# Altium footprint library PCB贴片元件封装库.pcblib: 366 footprints (part 22 of 23)
Each footprint in its own frame and in the unit in brackets; x right, y up, seen from the top. Pads: shape width x height; smd on the part's side, far side on the other; paste and mask are expansions set on the pad; w line width, h text height; cw(c..) or ccw(c..) is an arc to the next point about the centre after c.
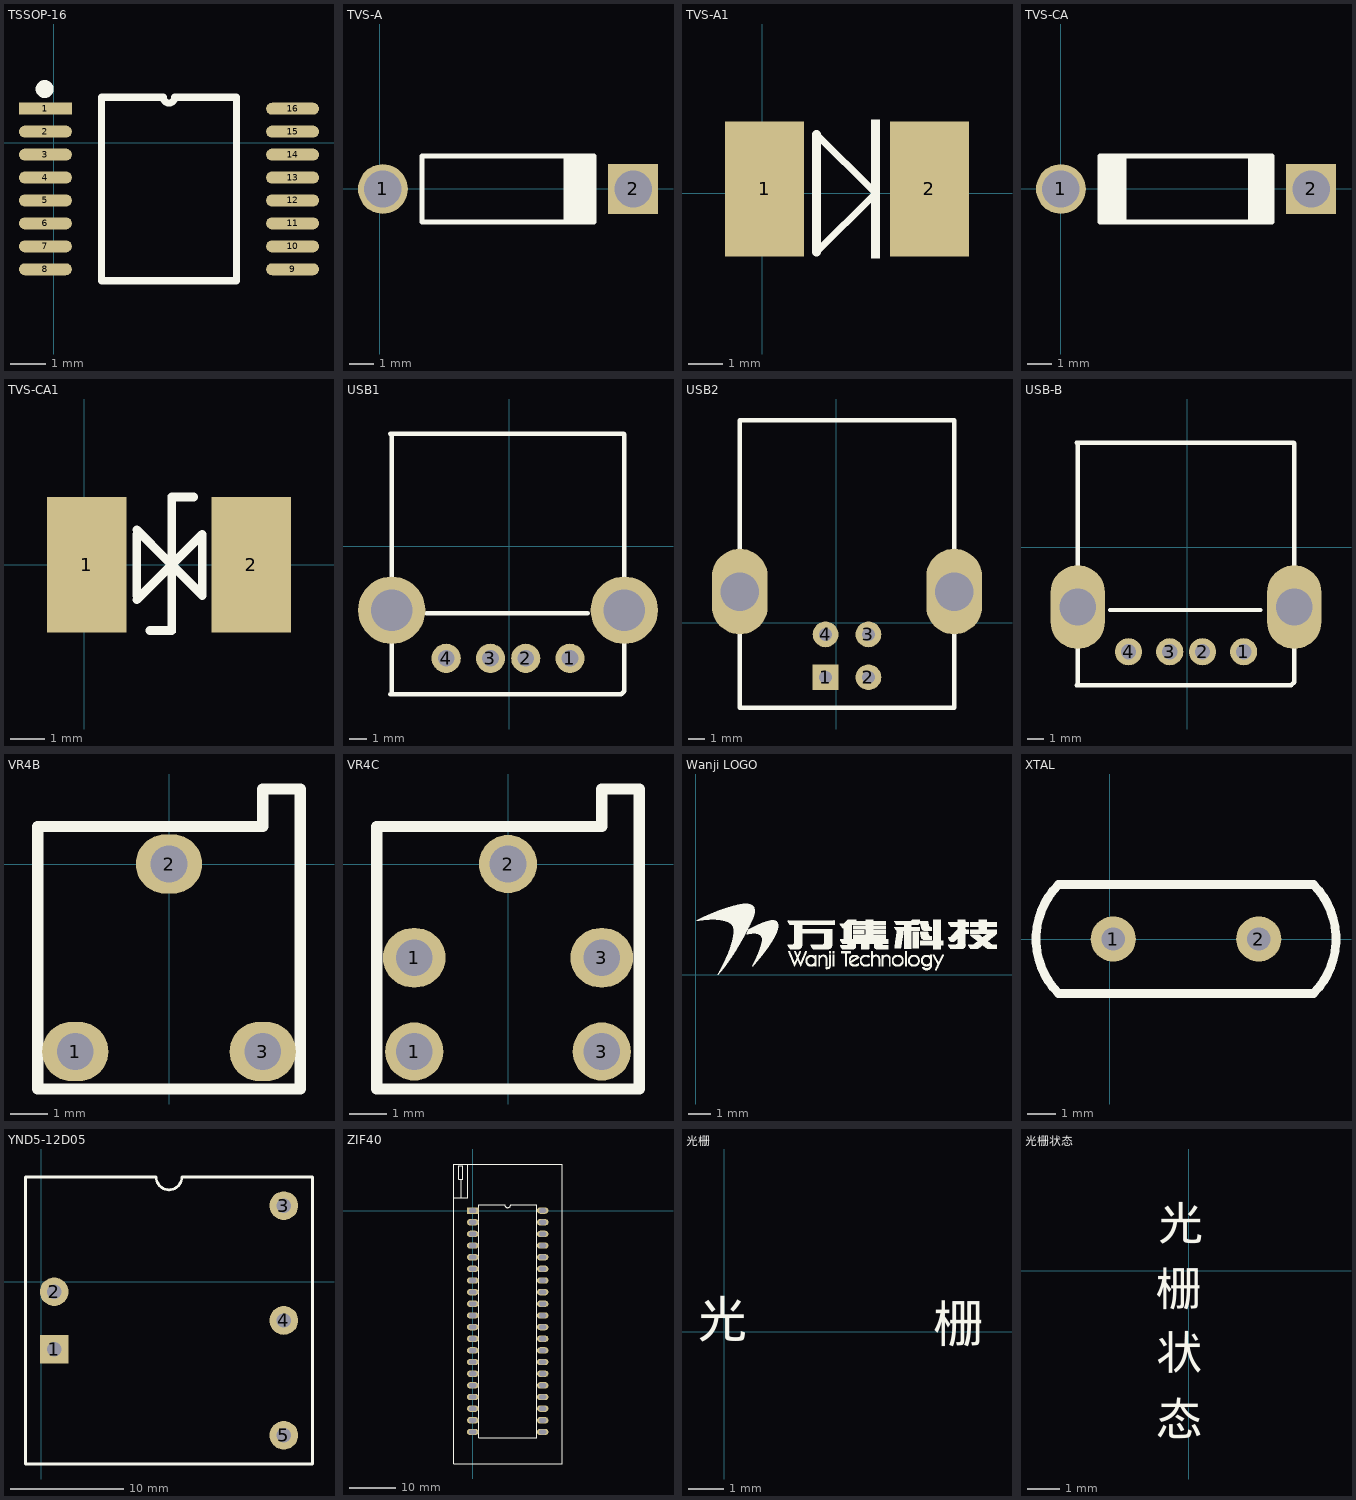
[diagram p21: the footprints below, top view; thin cyan lines are the x and y axes]

## TSSOP-16 [mm]
pads (16):
  rect 1.5x0.34 smd: 1(-0.232,0.968)
  oval 1.5x0.34 smd: 2(-0.232,0.318) 3(-0.232,-0.332) 4(-0.232,-0.982) 5(-0.232,-1.632) 6(-0.232,-2.282) 7(-0.232,-2.932) 8(-0.232,-3.582) 9(6.768,-3.582) 10(6.768,-2.932) 11(6.768,-2.282) 12(6.768,-1.632) 13(6.768,-0.982) 14(6.768,-0.332) 15(6.768,0.318) 16(6.768,0.968)
TopOverlay:
  circle w0.254: c-0.254,1.524 r0.127
  lines w0.2: 1.353,-3.907 5.183,-3.907 5.183,1.293 3.43,1.293 cw(c3.268,1.293) 3.106,1.293 1.353,1.293 1.353,-3.907

## TVS-A [mil]
pads (2):
  round 80 hole 60: 1(5,0)
  rect 80x80 hole 60: 2(406.57,0)
TopOverlay:
  rectangle: 295,-53.15 347.52,53.15
  lines w7.87: 343.58,-53.15 67.99,-53.15 67.99,53.15 343.58,53.15

## TVS-A1 [mm]
pads (2):
  rect 2.3x3.94 smd: 1(0.073,0.127) 2(4.873,0.127)
TopOverlay:
  rectangle: 3.175,-1.905 3.429,2.159
  lines w0.2: 1.587,-1.714 3.238,-0.064 ; 1.587,1.714 3.238,0.064
  lines w0.254: 1.587,-1.714 1.587,1.714

## TVS-CA [mil]
pads (2):
  round 80 hole 60: 1(0,0)
  rect 80x80 hole 60: 2(401.57,0)
TopOverlay:
  rectangle: 66.02,-53.15 105,53.15
  rectangle: 300,-53.15 342.52,53.15
  lines w7.87: 338.58,-53.15 62.99,-53.15 62.99,53.15 338.58,53.15

## TVS-CA1 [mm]
pads (2):
  rect 2.3x3.94 smd: 1(0.073,0) 2(4.848,0)
TopOverlay:
  rectangle: 2.413,-1.985 2.667,2.032
  lines w0.254: 1.524,-1.016 2.54,0 ; 1.524,-0.889 1.524,0.889 ; 1.524,1.016 2.413,0.127 ; 1.905,-1.905 2.54,-1.905 ; 2.54,1.973 3.175,1.973 ; 2.54,0 3.429,-0.889 3.429,0.889 2.54,0

## USB1 [mil]
pads (6):
  round 65 hole 37: 1(135,-250) 2(36.5,-250) 3(-42,-250) 4(-140.6,-250)
  round 150 hole 93: ""(-262,-143) ""(256,-143)
TopOverlay:
  lines w10: -265,-330 249,-330 256,-323 256,-143 256,249 255,250 -265,250 -262,247 -262,227 -262,-143 -262,-327 ; -185,-150 175,-150

## USB2 [mil]
pads (6):
  rect 60x60 hole 30: 1(-25,-127.6)
  round 60 hole 30: 2(75,-127.6) 3(75,-27.6) 4(-25,-27.6)
  oval 130x200 hole 90: ""(-225,72.4) ""(275,72.4)
TopOverlay:
  lines w10: -225,-199 -225,472.4 275,472.4 275,-199 -225,-199

## USB-B [mil]
pads (6):
  round 65 hole 37: 1(135,-250) 2(36.5,-250) 3(-42,-250) 4(-140.6,-250)
  oval 130x200 hole 88: ""(-262,-143) ""(256,-143)
TopOverlay:
  lines w10: -265,-330 249,-330 256,-323 256,-143 256,249 255,250 -265,250 -262,247 -262,227 -262,-143 -262,-327 ; -185,-150 175,-150

## VR4B [mm]
pads (3):
  oval 1.8x1.6 hole 1: 1(-2.54,-5.08) 2(0,0) 3(2.54,-5.08)
TopOverlay:
  lines w0.305: -3.556,-6.096 3.556,-6.096 3.556,2.032 2.54,2.032 2.54,1.016 -3.556,1.016 -3.556,-6.096

## VR4C [mm]
pads (5):
  round 1.575 hole 1: 1(-2.54,-5.08) 2(0,0) 3(2.54,-5.08)
  oval 1.7x1.6 hole 1: 1(-2.54,-2.54) 3(2.54,-2.54)
TopOverlay:
  lines w0.305: -3.556,-6.096 -3.556,1.016 2.54,1.016 2.54,2.032 3.556,2.032 3.556,-6.096 -3.556,-6.096

## Wanji LOGO [mil]
TopOverlay:
  drawing of 6345 lines, arcs and shapes, not listed

## XTAL [mil]
pads (2):
  round 62 hole 32: 1(5,0) 2(205,0)
TopOverlay:
  lines w12: -70,-75 cw(c5,0) -70,75 280,75 cw(c205,0) 280,-75 -70,-75

## YND5-12D05 [mil]
pads (5):
  rect 100x100 hole 50: 1(45,-235)
  round 100 hole 50: 2(45,-35) 3(845,265) 4(845,-135) 5(845,-535)
TopOverlay:
  lines w10: -55,-635 945,-635 945,365 490,365 cw(c445,365) 400,365 -55,365 -55,-635

## ZIF40 [mm]
height 1.1
pads (40):
  rect 2.5x1.38 hole 1 slot 1.5 at 0 deg: 1(0,0)
  oval 2.5x1.38 hole 1 slot 1.5 at 0 deg: 2(0,-2.54) 3(0,-5.08) 4(0,-7.62) 5(0,-10.16) 6(0,-12.7) 7(0,-15.24) 8(0,-17.78) 9(0,-20.32) 10(0,-22.86) 11(0,-25.4) 12(0,-27.94) 13(0,-30.48) 14(0,-33.02) 15(0,-35.56) 16(0,-38.1) 17(0,-40.64) 18(0,-43.18) 19(0,-45.72) 20(0,-48.26) 21(15.24,-48.26) 22(15.24,-45.72) 23(15.24,-43.18) 24(15.24,-40.64) 25(15.24,-38.1) 26(15.24,-35.56) 27(15.24,-33.02) 28(15.24,-30.48) 29(15.24,-27.94) 30(15.24,-25.4) 31(15.24,-22.86) 32(15.24,-20.32) 33(15.24,-17.78) 34(15.24,-15.24) 35(15.24,-12.7) 36(15.24,-10.16) 37(15.24,-7.62) 38(15.24,-5.08) 39(15.24,-2.54) 40(15.24,0)
TopOverlay:
  lines w0.254: -4.191,0 -4.191,10.16 19.558,10.16 19.558,0 19.558,-55.245 -1.397,-55.245 ; -4.191,0.762 -4.191,-55.245 -1.27,-55.245 ; -4.064,2.794 -1.143,2.794 -1.143,4.953 -1.143,10.16 ; -2.54,2.794 -2.54,6.858 ; -2.159,6.985 -2.159,6.858 ; -2.159,6.858 -3.048,6.858 -3.048,9.779 -2.159,9.779 -2.159,6.858 ; 1.27,-49.53 13.97,-49.53 13.97,1.27 8.255,1.27 cw(c7.62,1.27) 6.985,1.27 1.27,1.27 1.27,-49.53

## 光栅 [mil]
TopOverlay:
  text "光" at -30,-20 h70
  text "栅" at 230,-25 h70

## 光栅状态 [mil]
TopOverlay:
  text "光" at -37,23 h70
  text "栅" at -39.07,-55.15 h70
  text "状" at -39,-131.61 h70
  text "态" at -39,-211.21 h70